# Altium footprint library Lib_001_rus.PcbLib: 38 footprints (part 1 of 3)
Each footprint in its own frame and in the unit in brackets; x right, y up, seen from the top. Pads: shape width x height; smd on the part's side, far side on the other; paste and mask are expansions set on the pad; w line width, h text height; cw(c..) or ccw(c..) is an arc to the next point about the centre after c.
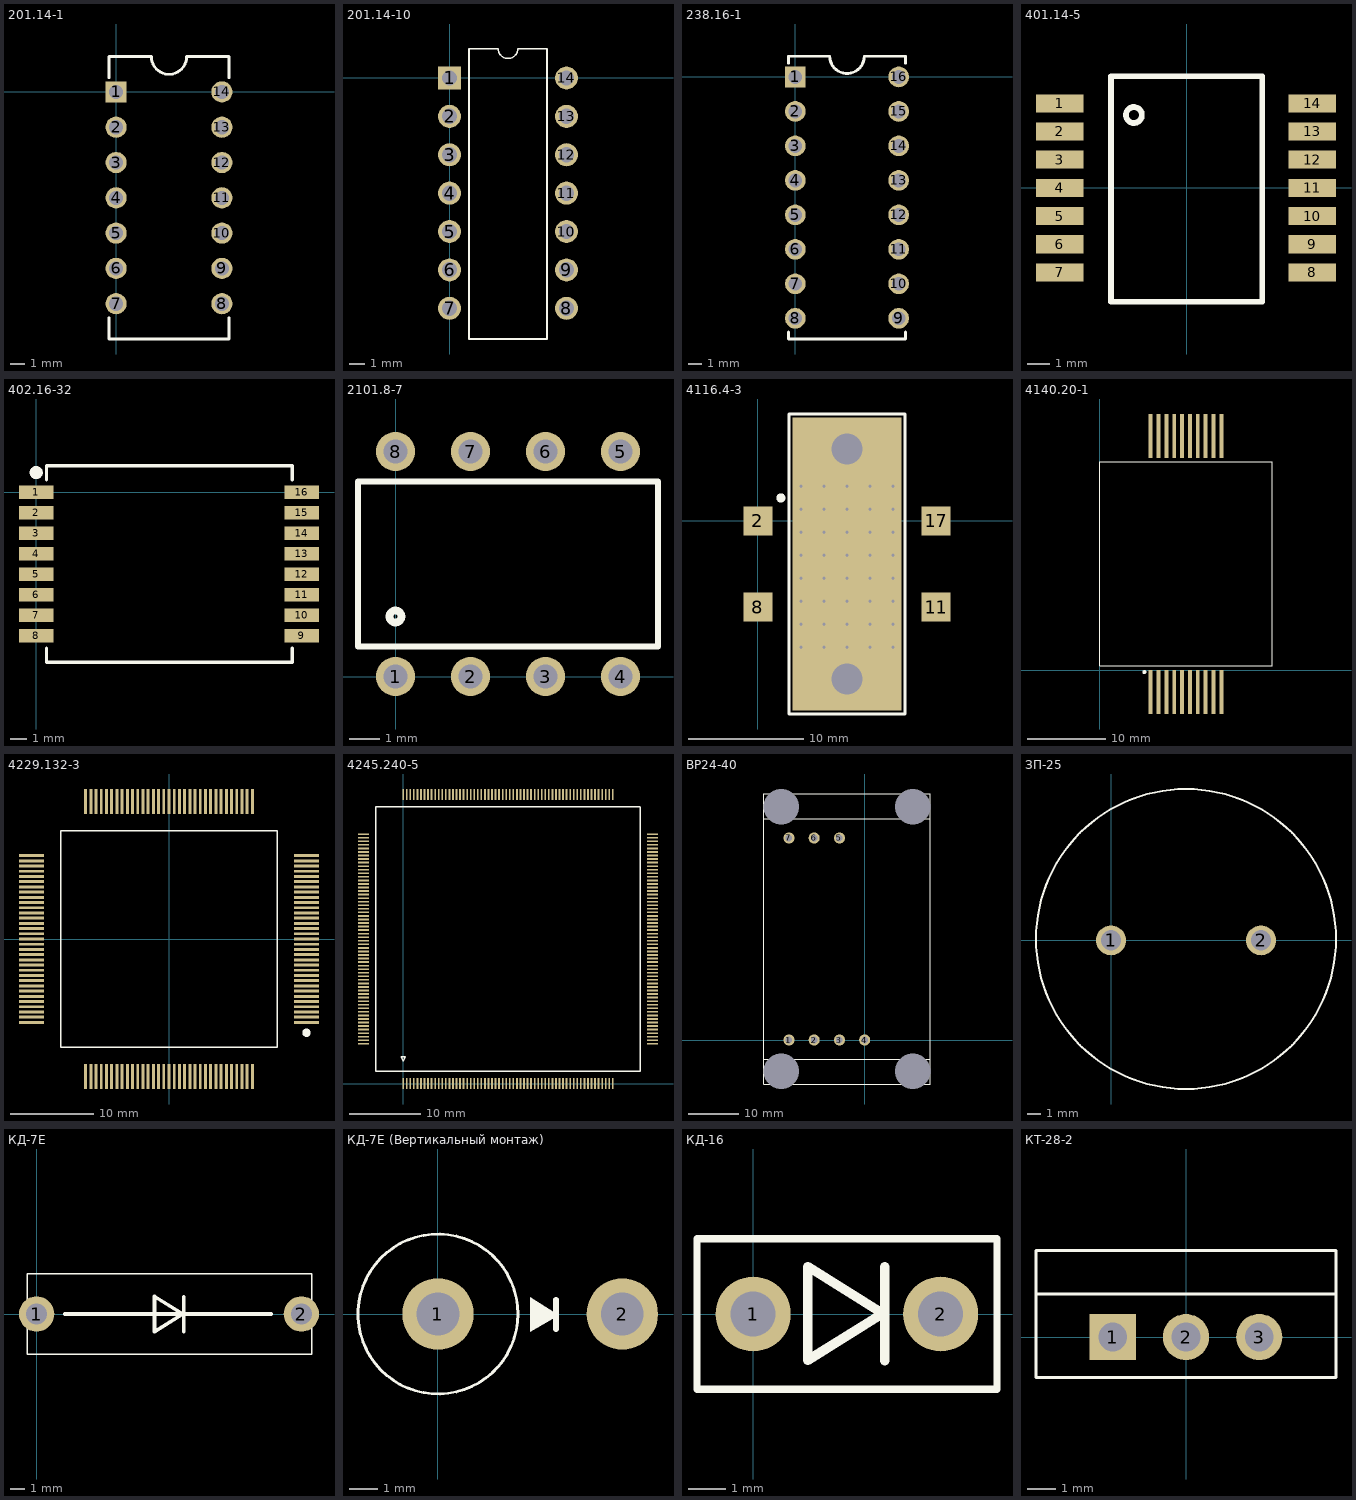
[diagram p0: the footprints below, top view; thin cyan lines are the x and y axes]

## 201.14-1 [mm]
pads (14):
  rect 1.5x1.5 hole 1: 1(0,0)
  round 1.5 hole 1: 2(0,-2.5) 3(0,-5) 4(0,-7.5) 5(0,-10) 6(0,-12.5) 7(0,-15) 8(7.5,-15) 9(7.5,-12.5) 10(7.5,-10) 11(7.5,-7.5) 12(7.5,-5) 13(7.5,-2.5) 14(7.5,0)
Top Overlay:
  lines w0.2: -0.5,-16 -0.5,-17.5 8,-17.5 8,-16 ; -0.5,1 -0.5,2.5 2.5,2.5 ccw(c3.75,2.5) 5,2.5 8,2.5 8,1
3D body "201.14-1.stp": height 4.29, standoff -2.95, extent -0.123,-17.146 7.623,2.146

## 201.14-10 [mm]
height 5.08
pads (14):
  rect 1.5x1.5 hole 1: 1(0,0)
  round 1.5 hole 1: 2(0,-2.5) 3(0,-5) 4(0,-7.5) 5(0,-10) 6(0,-12.5) 7(0,-15) 8(7.62,-15) 9(7.62,-12.5) 10(7.62,-10) 11(7.62,-7.5) 12(7.62,-5) 13(7.62,-2.5) 14(7.62,0)
Top Overlay:
  lines w0.1: 1.27,-17 6.35,-17 6.35,1.905 4.445,1.905 cw(c3.81,1.905) 3.175,1.905 1.27,1.905 1.27,-17
3D body "201.14-10.STEP": height 4.1, standoff -2.5, extent -0.101,-17.1 7.701,2.1

## 238.16-1 [mm]
pads (16):
  rect 1.5x1.5 hole 1: 1(0,0)
  round 1.5 hole 1: 2(0,-2.5) 3(0,-5) 4(0,-7.5) 5(0,-10) 6(0,-12.5) 7(0,-15) 8(0,-17.5) 9(7.5,-17.5) 10(7.5,-15) 11(7.5,-12.5) 12(7.5,-10) 13(7.5,-7.5) 14(7.5,-5) 15(7.5,-2.5) 16(7.5,0)
Top Overlay:
  lines w0.2: -0.5,-18.5 -0.5,-19 8,-19 8,-18.5 ; -0.5,1 -0.5,1.5 2.5,1.5 ccw(c3.75,1.5) 5,1.5 8,1.5 8,1
3D body "238.16-1.stp": height 4.59, standoff -2.95, extent -0.123,-18.295 7.623,0.8

## 401.14-5 [mm]
pads (14):
  rect 2.1x0.8 smd: 1(-5.625,3.75) 2(-5.625,2.5) 3(-5.625,1.25) 4(-5.625,0) 5(-5.625,-1.25) 6(-5.625,-2.5) 7(-5.625,-3.75) 8(5.575,-3.75) 9(5.575,-2.5) 10(5.575,-1.25) 11(5.575,0) 12(5.575,1.25) 13(5.575,2.5) 14(5.575,3.75)
Top Overlay:
  circle w0.254: c-2.335,3.23 r0.354
  lines w0.254: -3.35,-5.05 -3.35,4.95 3.35,4.95 3.35,-5.05 -3.35,-5.05
3D body "User Library-401_14-5-1.step": height 1.4, standoff 0, extent -4.975,-5.05 4.925,4.95

## 402.16-32 [mm]
pads (16):
  rect 2.1x0.8 smd: 1(0,0) 2(0,-1.25) 3(0,-2.5) 4(0,-3.75) 5(0,-5) 6(0,-6.25) 7(0,-7.5) 8(0,-8.75) 9(16.2,-8.75) 10(16.2,-7.5) 11(16.2,-6.25) 12(16.2,-5) 13(16.2,-3.75) 14(16.2,-2.5) 15(16.2,-1.25) 16(16.2,0)
Top Overlay:
  circle w0.4: c0,1.2 r0.2
  lines w0.2: 0.625,-9.5 0.625,-10.375 15.625,-10.375 15.625,-9.5 ; 0.625,0.75 0.625,1.625 15.625,1.625 15.625,0.75
3D body "402_16.stp": height 2.5, standoff 0, extent 0.875,-10.125 15.375,1.375

## 2101.8-7 [mm]
pads (8):
  round 1.3 hole 0.8: 1(0,0) 2(2.5,0) 3(5,0) 4(7.5,0) 5(7.5,7.5) 6(5,7.5) 7(2.5,7.5) 8(0,7.5)
Top Overlay:
  circle w0.254: c0,2 r0.2
  lines w0.2: -1.25,1 8.75,1 8.75,6.5 -1.25,6.5 -1.25,1
3D body "User Library-2101_8-7.STEP": height 4.6, standoff -2.6, extent -1.25,-0.16 8.75,7.66

## 4116.4-3 [mm]
pads (47):
  rect 2.5x2.5 smd: 2(0,0) 8(0,-7.5) 11(15.5,-7.5) 17(15.5,0)
  round 0.7 hole 0.3: ""(3.75,-11) ""(3.75,-9) ""(3.75,-7) ""(3.75,-5) ""(3.75,-3) ""(3.75,-1) ""(3.75,1) ""(3.75,3) ""(5.75,-11) ""(5.75,-9) ""(5.75,-7) ""(5.75,-5) ""(5.75,-3) ""(5.75,-1) ""(5.75,1) ""(5.75,3) ""(7.75,-11) ""(7.75,-9) ""(7.75,-7) ""(7.75,-5) ""(7.75,-3) ""(7.75,-1) ""(7.75,1) ""(7.75,3) ""(9.75,-11) ""(9.75,-9) ""(9.75,-7) ""(9.75,-5) ""(9.75,-3) ""(9.75,-1) ""(9.75,1) ""(9.75,3) ""(11.75,-11) ""(11.75,-9) ""(11.75,-7) ""(11.75,-5) ""(11.75,-3) ""(11.75,-1) ""(11.75,1) ""(11.75,3)
  round 3.5 hole 2.7: ""(7.75,-13.75) ""(7.75,6.25)
  rect 9.5x25.5 smd: ""(7.75,-3.75)
Top Overlay:
  circle w0.4: c2,2 r0.2
  lines w0.254: 2.7,-16.8 2.7,9.3 12.8,9.3 12.8,-16.8 2.7,-16.8
3D body "4116.4-3.step": height 3.35, standoff 0, extent -1,-16.25 16.5,8.75

## 4140.20-1 [mm]
pads (20):
  rect 0.5x5.6 smd: 1(6.5,-2.75) 2(7.5,-2.75) 3(8.5,-2.75) 4(9.5,-2.75) 5(10.5,-2.75) 6(11.5,-2.75) 7(12.5,-2.75) 8(13.5,-2.75) 9(14.5,-2.75) 10(15.5,-2.75) 11(15.5,29.9) 12(14.5,29.9) 13(13.5,29.9) 14(12.5,29.9) 15(11.5,29.9) 16(10.5,29.9) 17(9.5,29.9) 18(8.5,29.9) 19(7.5,29.9) 20(6.5,29.9)
Top Overlay:
  circle w0.254: c5.7,-0.2 r0.141
  lines w0.1: 0,0.583 22,0.583 22,26.583 0,26.583 0,0.583
3D body "Миландр. STEP-модель для корпуса 4140.20-1.STEP": height 6.56, standoff 0.01, extent 0,-5.667 22,32.833

## 4229.132-3 [mm] "(Формованные выводы!!!!)"
pads (132):
  rect 3x0.35 smd paste+0: 1(16.5,-10) 2(16.5,-9.375) 3(16.5,-8.75) 4(16.5,-8.125) 5(16.5,-7.5) 6(16.5,-6.875) 7(16.5,-6.25) 8(16.5,-5.625) 9(16.5,-5) 10(16.5,-4.375) 11(16.5,-3.75) 12(16.5,-3.125) 13(16.5,-2.5) 14(16.5,-1.875) 15(16.5,-1.25) 16(16.5,-0.625) 17(16.5,0) 18(16.5,0.625) 19(16.5,1.25) 20(16.5,1.875) 21(16.5,2.5) 22(16.5,3.125) 23(16.5,3.75) 24(16.5,4.375) 25(16.5,5) 26(16.5,5.625) 27(16.5,6.25) 28(16.5,6.875) 29(16.5,7.5) 30(16.5,8.125) 31(16.5,8.75) 32(16.5,9.375) 33(16.5,10) 67(-16.5,10) 68(-16.5,9.375) 69(-16.5,8.75) 70(-16.5,8.125) 71(-16.5,7.5) 72(-16.5,6.875) 73(-16.5,6.25) 74(-16.5,5.625) 75(-16.5,5) 76(-16.5,4.375) 77(-16.5,3.75) 78(-16.5,3.125) 79(-16.5,2.5) 80(-16.5,1.875) 81(-16.5,1.25) 82(-16.5,0.625) 83(-16.5,0) 84(-16.5,-0.625) 85(-16.5,-1.25) 86(-16.5,-1.875) 87(-16.5,-2.5) 88(-16.5,-3.125) 89(-16.5,-3.75) 90(-16.5,-4.375) 91(-16.5,-5) 92(-16.5,-5.625) 93(-16.5,-6.25) 94(-16.5,-6.875) 95(-16.5,-7.5) 96(-16.5,-8.125) 97(-16.5,-8.75) 98(-16.5,-9.375) 99(-16.5,-10)
  rect 0.35x3 smd paste+0: 34(10,16.5) 35(9.375,16.5) 36(8.75,16.5) 37(8.125,16.5) 38(7.5,16.5) 39(6.875,16.5) 40(6.25,16.5) 41(5.625,16.5) 42(5,16.5) 43(4.375,16.5) 44(3.75,16.5) 45(3.125,16.5) 46(2.5,16.5) 47(1.875,16.5) 48(1.25,16.5) 49(0.625,16.5) 50(0,16.5) 51(-0.625,16.5) 52(-1.25,16.5) 53(-1.875,16.5) 54(-2.5,16.5) 55(-3.125,16.5) 56(-3.75,16.5) 57(-4.375,16.5) 58(-5,16.5) 59(-5.625,16.5) 60(-6.25,16.5) 61(-6.875,16.5) 62(-7.5,16.5) 63(-8.125,16.5) 64(-8.75,16.5) 65(-9.375,16.5) 66(-10,16.5) 100(-10,-16.5) 101(-9.375,-16.5) 102(-8.75,-16.5) 103(-8.125,-16.5) 104(-7.5,-16.5) 105(-6.875,-16.5) 106(-6.25,-16.5) 107(-5.625,-16.5) 108(-5,-16.5) 109(-4.375,-16.5) 110(-3.75,-16.5) 111(-3.125,-16.5) 112(-2.5,-16.5) 113(-1.875,-16.5) 114(-1.25,-16.5) 115(-0.625,-16.5) 116(0,-16.5) 117(0.625,-16.5) 118(1.25,-16.5) 119(1.875,-16.5) 120(2.5,-16.5) 121(3.125,-16.5) 122(3.75,-16.5) 123(4.375,-16.5) 124(5,-16.5) 125(5.625,-16.5) 126(6.25,-16.5) 127(6.875,-16.5) 128(7.5,-16.5) 129(8.125,-16.5) 130(8.75,-16.5) 131(9.375,-16.5) 132(10,-16.5)
Top Overlay:
  circle w0.5: c16.5,-11.245 r0.25
  lines w0.2: -13,-13 13,-13 13,13 -13,13 -13,-13
3D body "Миландр. STEP-модель для корпуса 4229.132-3 формованный.STEP": height 3.63, standoff -0.02, extent -17.1,-17.1 17.1,17.1

## 4245.240-5 [mm] "(Формованные выводы!!!!)"
pads (240):
  rect 0.25x1.524 smd: 1(0,0) 2(0.5,0) 3(1,0) 4(1.5,0) 5(2,0) 6(2.5,0) 7(3,0) 8(3.5,0) 9(4,0) 10(4.5,0) 11(5,0) 12(5.5,0) 13(6,0) 14(6.5,0) 15(7,0) 16(7.5,0) 17(8,0) 18(8.5,0) 19(9,0) 20(9.5,0) 21(10,0) 22(10.5,0) 23(11,0) 24(11.5,0) 25(12,0) 26(12.5,0) 27(13,0) 28(13.5,0) 29(14,0) 30(14.5,0) 31(15,0) 32(15.5,0) 33(16,0) 34(16.5,0) 35(17,0) 36(17.5,0) 37(18,0) 38(18.5,0) 39(19,0) 40(19.5,0) 41(20,0) 42(20.5,0) 43(21,0) 44(21.5,0) 45(22,0) 46(22.5,0) 47(23,0) 48(23.5,0) 49(24,0) 50(24.5,0) 51(25,0) 52(25.5,0) 53(26,0) 54(26.5,0) 55(27,0) 56(27.5,0) 57(28,0) 58(28.5,0) 59(29,0) 60(29.5,0) 121(29.5,40.7) 122(29,40.7) 123(28.5,40.7) 124(28,40.7) 125(27.5,40.7) 126(27,40.7) 127(26.5,40.7) 128(26,40.7) 129(25.5,40.7) 130(25,40.7) 131(24.5,40.7) 132(24,40.7) 133(23.5,40.7) 134(23,40.7) 135(22.5,40.7) 136(22,40.7) 137(21.5,40.7) 138(21,40.7) 139(20.5,40.7) 140(20,40.7) 141(19.5,40.7) 142(19,40.7) 143(18.5,40.7) 144(18,40.7) 145(17.5,40.7) 146(17,40.7) 147(16.5,40.7) 148(16,40.7) 149(15.5,40.7) 150(15,40.7) 151(14.5,40.7) 152(14,40.7) 153(13.5,40.7) 154(13,40.7) 155(12.5,40.7) 156(12,40.7) 157(11.5,40.7) 158(11,40.7) 159(10.5,40.7) 160(10,40.7) 161(9.5,40.7) 162(9,40.7) 163(8.5,40.7) 164(8,40.7) 165(7.5,40.7) 166(7,40.7) 167(6.5,40.7) 168(6,40.7) 169(5.5,40.7) 170(5,40.7) 171(4.5,40.7) 172(4,40.7) 173(3.5,40.7) 174(3,40.7) 175(2.5,40.7) 176(2,40.7) 177(1.5,40.7) 178(1,40.7) 179(0.5,40.7) 180(0,40.7)
  rect 1.524x0.25 smd: 61(35.1,5.6) 62(35.1,6.1) 63(35.1,6.6) 64(35.1,7.1) 65(35.1,7.6) 66(35.1,8.1) 67(35.1,8.6) 68(35.1,9.1) 69(35.1,9.6) 70(35.1,10.1) 71(35.1,10.6) 72(35.1,11.1) 73(35.1,11.6) 74(35.1,12.1) 75(35.1,12.6) 76(35.1,13.1) 77(35.1,13.6) 78(35.1,14.1) 79(35.1,14.6) 80(35.1,15.1) 81(35.1,15.6) 82(35.1,16.1) 83(35.1,16.6) 84(35.1,17.1) 85(35.1,17.6) 86(35.1,18.1) 87(35.1,18.6) 88(35.1,19.1) 89(35.1,19.6) 90(35.1,20.1) 91(35.1,20.6) 92(35.1,21.1) 93(35.1,21.6) 94(35.1,22.1) 95(35.1,22.6) 96(35.1,23.1) 97(35.1,23.6) 98(35.1,24.1) 99(35.1,24.6) 100(35.1,25.1) 101(35.1,25.6) 102(35.1,26.1) 103(35.1,26.6) 104(35.1,27.1) 105(35.1,27.6) 106(35.1,28.1) 107(35.1,28.6) 108(35.1,29.1) 109(35.1,29.6) 110(35.1,30.1) 111(35.1,30.6) 112(35.1,31.1) 113(35.1,31.6) 114(35.1,32.1) 115(35.1,32.6) 116(35.1,33.1) 117(35.1,33.6) 118(35.1,34.1) 119(35.1,34.6) 120(35.1,35.1) 181(-5.6,35.1) 182(-5.6,34.6) 183(-5.6,34.1) 184(-5.6,33.6) 185(-5.6,33.1) 186(-5.6,32.6) 187(-5.6,32.1) 188(-5.6,31.6) 189(-5.6,31.1) 190(-5.6,30.6) 191(-5.6,30.1) 192(-5.6,29.6) 193(-5.6,29.1) 194(-5.6,28.6) 195(-5.6,28.1) 196(-5.6,27.6) 197(-5.6,27.1) 198(-5.6,26.6) 199(-5.6,26.1) 200(-5.6,25.6) 201(-5.6,25.1) 202(-5.6,24.6) 203(-5.6,24.1) 204(-5.6,23.6) 205(-5.6,23.1) 206(-5.6,22.6) 207(-5.6,22.1) 208(-5.6,21.6) 209(-5.6,21.1) 210(-5.6,20.6) 211(-5.6,20.1) 212(-5.6,19.6) 213(-5.6,19.1) 214(-5.6,18.6) 215(-5.6,18.1) 216(-5.6,17.6) 217(-5.6,17.1) 218(-5.6,16.6) 219(-5.6,16.1) 220(-5.6,15.6) 221(-5.6,15.1) 222(-5.6,14.6) 223(-5.6,14.1) 224(-5.6,13.6) 225(-5.6,13.1) 226(-5.6,12.6) 227(-5.6,12.1) 228(-5.6,11.6) 229(-5.6,11.1) 230(-5.6,10.6) 231(-5.6,10.1) 232(-5.6,9.6) 233(-5.6,9.1) 234(-5.6,8.6) 235(-5.6,8.1) 236(-5.6,7.6) 237(-5.6,7.1) 238(-5.6,6.6) 239(-5.6,6.1) 240(-5.6,5.6)
Top Overlay:
  lines w0.2: 33.3,38.95 -3.875,38.95 -3.875,1.75 33.35,1.75 33.35,38.95 ; -0.275,3.8 0.3,3.8 0,3.15 -0.275,3.8
3D body "Миландр. STEP-модель для корпуса 4245.240-5 формованный.STEP": height 4, standoff -0.1, extent -5.668,-0.068 35.168,40.768

## ВР24-40 [mm]
pads (11):
  round 2.2 hole 1.3 unplated: 1(-15,0) 2(-10,0) 3(-5,0) 4(0,0) 5(-5,40) 6(-10,40) 7(-15,40)
  round 6 hole 7 unplated: ""(-16.5,-6.2) ""(-16.5,46.2) ""(9.5,-6.2) ""(9.5,46.2)
Top Overlay:
  lines w0.15: -20,-3.8 13,-3.8 ; -20,43.8 13,43.8 ; 13,-3.8 13,43.8 ; 13,-3.8 13,-8.75 -5.35,-8.75 -20,-8.75 -20,48.75 13,48.75 13,43.8
3D body: height 12.5, standoff 10.5, extent -20,-8.75 13,48.75
3D body: height 12.5, standoff 0, extent -20,-3.8 13,43.8
3D body: height 1, standoff -3, extent -0.496,-0.499 0.5,0.499
3D body: height 1, standoff -3, extent -5.496,-0.499 -4.5,0.499
3D body: height 1, standoff -3, extent -10.496,-0.499 -9.5,0.499
3D body: height 1, standoff -3, extent -15.496,-0.499 -14.5,0.499
3D body: height 1, standoff -3, extent -5.496,39.501 -4.5,40.499
3D body: height 1, standoff -3, extent -10.496,39.501 -9.5,40.499
3D body: height 1, standoff -3, extent -15.496,39.501 -14.5,40.499

## ЗП-25 [mm] "Звонок пьезокерамический"
pads (2):
  round 2.2 hole 1.5 unplated: 1(0,0) 2(11,0)
Top Overlay:
  circle w0.15: c5.5,0.1 r11
3D body: height 9, standoff 0, extent -5.5,-10.9 16.5,11.094
3D body: height 1, standoff -2, extent -0.503,-0.354 0.504,0.354
3D body: height 1, standoff -2, extent 10.496,-0.354 11.503,0.354

## КД-7Е [mm] "D1.5,S2.5,R17.5"
pads (2):
  round 2.5 hole 1.5: 1(0,0) 2(18.75,0)
Top Overlay:
  lines w0.1: -0.675,-2.85 -0.675,2.85 4.9,2.85 13.025,2.85 19.475,2.85 19.475,-2.85 13.025,-2.85 4.9,-2.85 -0.675,-2.85
  lines w0.254: 2,0 16.62,0 ; 10.41,-1.27 10.41,1.23 ; 8.35,-1.26 8.35,1.24 10.35,-0.01 8.35,-1.26
3D body "User Library-DO-201ADDO-27.step": height 5.82, standoff -3.8, extent -0.67,-2.795 19.47,2.845

## КД-7Е (Вертикальный монтаж) [mm]
height 100
pads (2):
  round 2.5 hole 1.5: 1(0,0) 2(6.455,0)
Top Overlay:
  circle w0.1: c0,0 r2.8
  region: 3.23,0.588 3.23,-0.625 4.23,-0.038
  lines w0.2: 4.13,-0.525 4.13,0.5
3D body "User Library-User Library-DO-201AV-Vertical_2001.STEP": height 15.69, standoff -3, extent -2.8,-2.8 7.09,2.8

## КД-16 [mm]
height 10
pads (2):
  round 2 hole 1.2: 1(0,0) 2(5,0)
Top Overlay:
  lines w0.2: -1.5,-2 -1.5,0 -1.5,2 6.5,2 6.5,0 6.5,-2 -1.5,-2
  lines w0.254: 3.51,-1.245 3.51,1.255 ; 1.45,-1.235 3.45,0.015 1.45,1.265 1.45,-1.235
3D body "КД16.stp": height 9.05, standoff -3.95, extent -1.5,-2 6.5,2
3D body: height 0, standoff -2, extent 4.499,-0.504 5.505,0.504
3D body: height 0, standoff -2, extent -0.501,-0.504 0.505,0.504

## КТ-28-2 [mm]
height 4.7
pads (3):
  rect 1.6x1.6 hole 1: 1(-2.54,0)
  round 1.6 hole 1: 2(0,0) 3(2.54,0)
Top Overlay:
  lines w0.1: -5.2,1.5 5.2,1.5 ; -5.2,-1.4 5.2,-1.4 5.2,3 -5.2,3 -5.2,-1.4
3D body "TO-220AC_vert.STEP": height 19.5, standoff -2.5, extent -5.2,-1.4 5.2,3